# Altium footprint library ICs.PcbLib: 29 footprints (part 2 of 2)
Each footprint in its own frame and in the unit in brackets; x right, y up, seen from the top. Pads: shape width x height; smd on the part's side, far side on the other; paste and mask are expansions set on the pad; w line width, h text height; cw(c..) or ccw(c..) is an arc to the next point about the centre after c.
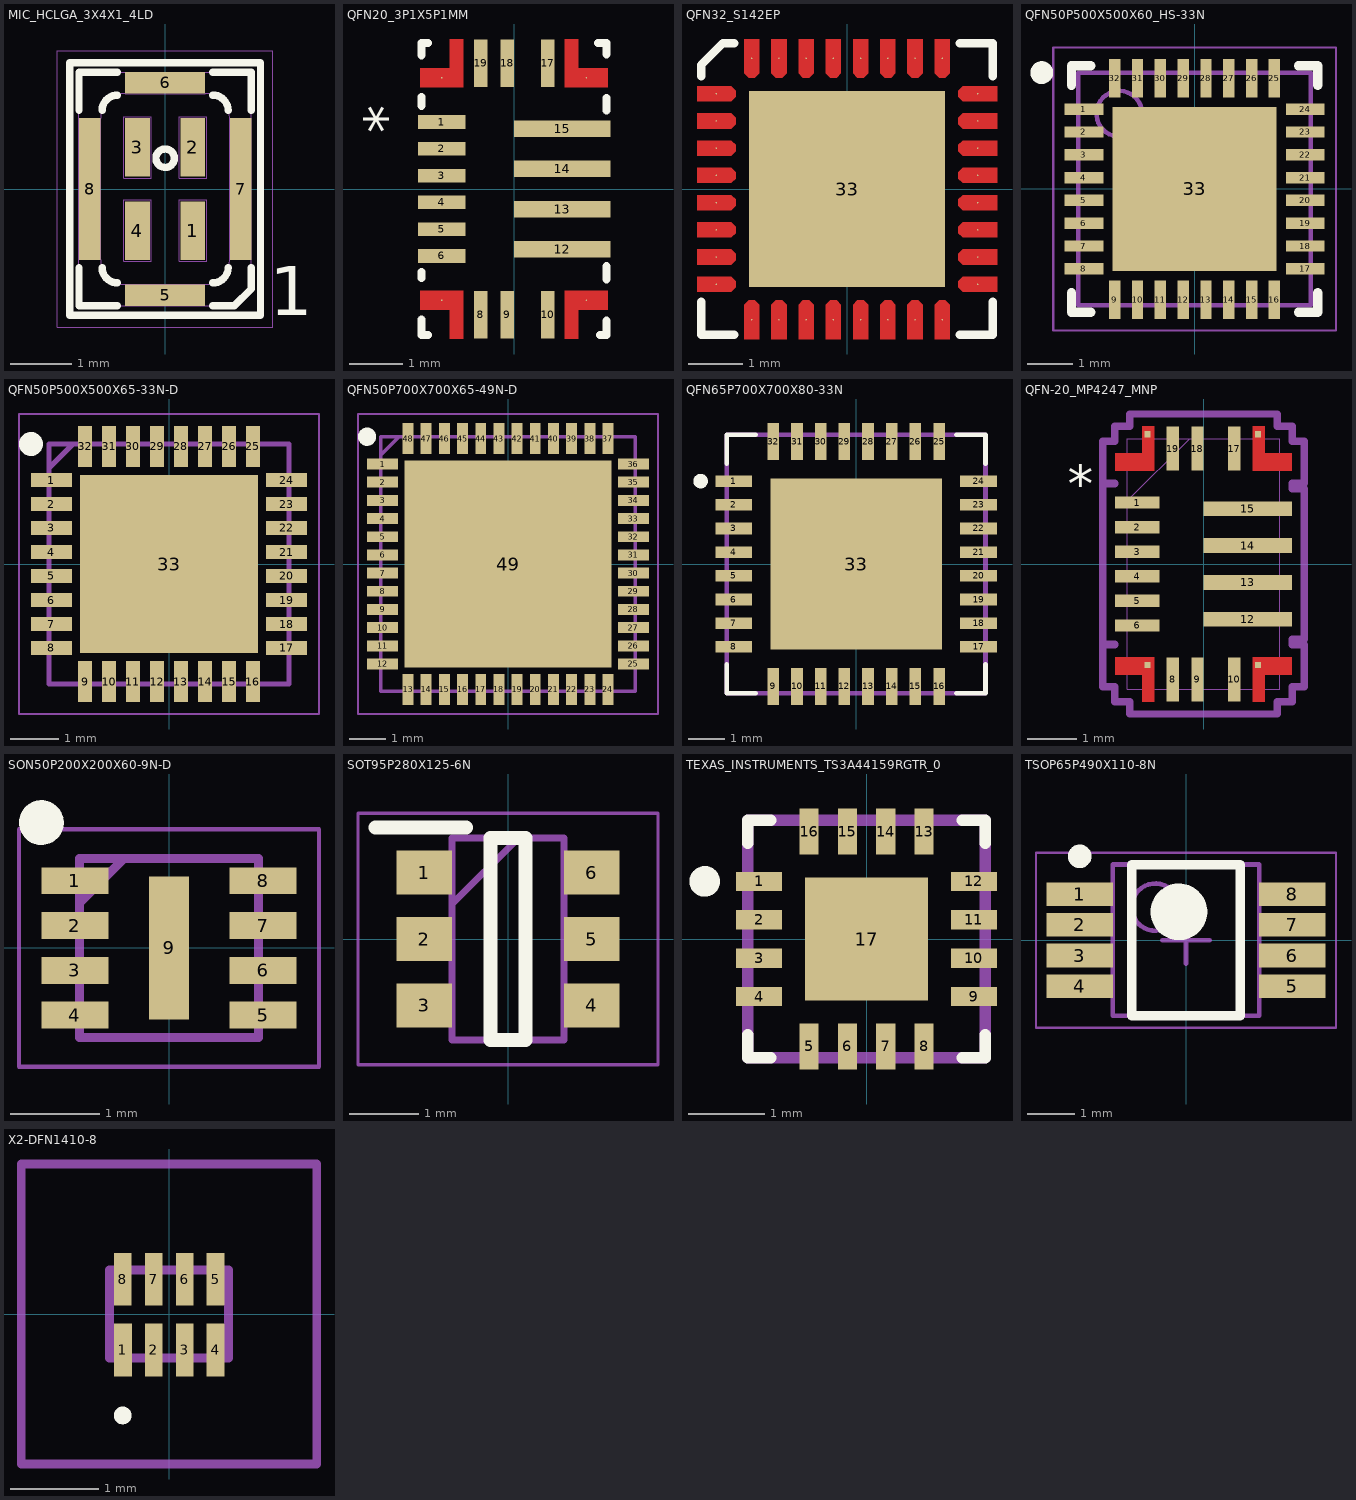
[diagram p1: the footprints below, top view; thin cyan lines are the x and y axes]

## MIC_HCLGA_3X4X1_4LD [mm]
pads (8):
  rect 0.4x0.95 smd paste+0 mask+0.05: 1(0.45,-0.675) 2(0.45,0.675) 3(-0.45,0.675) 4(-0.45,-0.675)
  rect 1.3x0.35 smd paste+0 mask+0.05: 5(0,-1.725) 6(0,1.725)
  rect 0.35x2.3 smd paste+0 mask+0.05: 7(1.225,0) 8(-1.225,0)
Top Overlay:
  circle w0.12: c0,0.5 r0.15
  lines w0.12: -1.4,-1.275 -1.4,-1.9 -0.775,-1.9 ; -1.4,1.275 -1.4,1.9 -0.775,1.9 ; -1.025,-1.275 ccw(c-0.775,-1.275) -0.775,-1.525 ; -1.025,1.275 cw(c-0.775,1.275) -0.775,1.525 ; 0.775,-1.9 1.125,-1.9 1.4,-1.625 1.4,-1.275 ; 0.775,-1.525 ccw(c0.775,-1.275) 1.025,-1.275 ; 0.775,1.525 cw(c0.775,1.275) 1.025,1.275 ; 0.775,1.9 1.4,1.9 1.4,1.275 ; -1.55,-2.05 1.55,-2.05 1.55,2.05 -1.55,2.05 -1.55,-2.05
  text "1" at 1.7,-2.05 h0.8
Mechanical 20:
  lines w0.01: -1.75,-2.25 1.75,-2.25 1.75,2.25 -1.75,2.25 -1.75,-2.25
Mechanical 27:
  circle w0.01: c0,0.5 r0.175
  lines w0.01: -1.55,-2.05 -1.55,2.05 1.55,2.05 1.55,-2.05 -1.55,-2.05 ; -1.4,-1.9 0.65,-1.9 0.875,-1.9 1.125,-1.9 1.4,-1.625 1.4,1.15 1.4,1.9 -1.4,1.9 -1.4,-1.875 -1.4,-1.9 ; -1.05,-1.15 ccw(c-0.65,-1.15) -0.65,-1.55 0.65,-1.55 ccw(c0.65,-1.15) 1.05,-1.15 1.05,1.15 ccw(c0.65,1.15) 0.65,1.55 -0.65,1.55 ccw(c-0.65,1.15) -1.05,1.15 -1.05,-1.15 ; -0.675,-1.175 -0.675,-0.175 -0.225,-0.175 -0.225,-1.175 -0.675,-1.175 ; -0.675,0.175 -0.225,0.175 -0.225,1.175 -0.675,1.175 -0.675,0.175 ; 0.225,-1.175 0.225,-0.175 0.675,-0.175 0.675,-1.175 0.225,-1.175 ; 0.225,0.175 0.225,1.175 0.675,1.175 0.675,0.175 0.225,0.175
  text "1" at 0.35,-0.925 h0.5
  text "3" at -0.675,0.325 h0.5
  text "4" at -0.675,-1.05 h0.5
  text "2" at 0.2,0.325 h0.5
3D body: height 1.03, standoff 1.02, extent -0.099,0.4 0.1,0.6
3D body: height 1.02, standoff 1.01, extent -0.248,0.251 0.25,0.75
3D body: height 1.01, standoff 1, extent -0.347,0.151 0.35,0.849
3D body: height 1, standoff 0, extent -1.45,-1.95 1.45,1.95

## QFN20_3P1X5P1MM [mil] "QFN20_3P1X5P1MM"
pads (20):
  rect 35x10 smd mask+2: 1(-53.29,49.21) 2(-53.29,29.53) 3(-53.29,9.84) 4(-53.29,-9.84) 5(-53.29,-29.53) 6(-53.29,-49.21)
  round 1 smd mask+2: 7(-53.29,-81.69) 11(53.01,-81.69) 16(53.01,81.69) 20(-53.29,81.69)
  rect 10x35 smd mask+2: 8(-24.75,-92.52) 9(-5.06,-92.52) 10(24.47,-92.52) 17(24.47,92.52) 18(-5.06,92.52) 19(-24.75,92.52)
  rect 71x12 smd mask+2: 12(35.29,-44.29) 13(35.29,-14.76) 14(35.29,14.76) 15(35.29,44.29)
Top Layer:
  region: -69.04,74.8 -69.04,88.58 -47.38,88.58 -47.38,110.23 -37.54,110.23 -37.54,74.8
  region: 37.26,110.23 37.26,74.8 68.76,74.8 68.76,88.58 47.1,88.58 47.1,110.23
  region: -37.54,-110.23 -37.54,-74.8 -69.04,-74.8 -69.04,-88.58 -47.38,-88.58 -47.38,-110.23
  region: 68.76,-74.8 68.76,-88.58 47.1,-88.58 47.1,-110.23 37.26,-110.23 37.26,-74.8
Top Overlay:
  lines w6: -68.16,-95.92 -68.16,-107.39 -63.42,-107.39 ; -68.16,-65.31 -68.16,-61.09 ; -68.16,61.17 -68.16,67.64 ; -68.16,98.24 -68.16,107.39 -63.29,107.39 ; 61.47,107.39 67.88,107.39 67.88,98.98 ; 63.08,-107.39 67.88,-107.39 67.88,-96.87 ; 67.88,-66.28 67.88,-56.71 ; 67.88,57.8 67.88,66.91
  text ".Designator" at -107,-172 h35
  text "*" at -80,41 h30
3D body "MP4247GQV.step": height 32.53, standoff -0.94, extent -59,-98.43 59.11,98.43

## QFN32_S142EP [mil] "QFN32_S142EP"
pads (33):
  round 1 smd: 1(-94.5,68.95) 2(-94.5,49.25) 3(-94.5,29.55) 4(-94.5,9.85) 5(-94.5,-9.85) 6(-94.5,-29.55) 7(-94.5,-49.25) 8(-94.5,-68.95) 9(-68.95,-94.5) 10(-49.25,-94.5) 11(-29.55,-94.5) 12(-9.85,-94.5) 13(9.85,-94.5) 14(29.55,-94.5) 15(49.25,-94.5) 16(68.95,-94.5) 17(94.5,-68.95) 18(94.5,-49.25) 19(94.5,-29.55) 20(94.5,-9.85) 21(94.5,9.85) 22(94.5,29.55) 23(94.5,49.25) 24(94.5,68.95) 25(68.95,94.5) 26(49.25,94.5) 27(29.55,94.5) 28(9.85,94.5) 29(-9.85,94.5) 30(-29.55,94.5) 31(-49.25,94.5) 32(-68.95,94.5)
  rect 142x142 smd: 33(0,0)
Top Layer:
  region: -108.5,63.45 -108.5,74.45 -86,74.45 -83.72,74.45 -80.5,71.23 -80.5,66.67 -83.72,63.45 -86,63.45
  region: -108.5,-74.45 -108.5,-63.45 -86,-63.45 -83.72,-63.45 -80.5,-66.67 -80.5,-71.23 -83.72,-74.45 -86,-74.45
  region: -108.5,-54.75 -108.5,-43.75 -86,-43.75 -83.72,-43.75 -80.5,-46.97 -80.5,-51.53 -83.72,-54.75 -86,-54.75
  region: -108.5,-35.05 -108.5,-24.05 -86,-24.05 -83.72,-24.05 -80.5,-27.27 -80.5,-31.83 -83.72,-35.05 -86,-35.05
  region: -108.5,-15.35 -108.5,-4.35 -86,-4.35 -83.72,-4.35 -80.5,-7.57 -80.5,-12.13 -83.72,-15.35 -86,-15.35
  region: -108.5,4.35 -108.5,15.35 -86,15.35 -83.72,15.35 -80.5,12.13 -80.5,7.57 -83.72,4.35 -86,4.35
  region: -108.5,24.05 -108.5,35.05 -86,35.05 -83.72,35.05 -80.5,31.83 -80.5,27.27 -83.72,24.05 -86,24.05
  region: -108.5,43.75 -108.5,54.75 -86,54.75 -83.72,54.75 -80.5,51.53 -80.5,46.97 -83.72,43.75 -86,43.75
  region: -74.45,108.5 -63.45,108.5 -63.45,86 -63.45,83.72 -66.67,80.5 -71.23,80.5 -74.45,83.72 -74.45,86
  region: -63.45,-108.5 -74.45,-108.5 -74.45,-86 -74.45,-83.72 -71.23,-80.5 -66.67,-80.5 -63.45,-83.72 -63.45,-86
  region: -54.75,108.5 -43.75,108.5 -43.75,86 -43.75,83.72 -46.97,80.5 -51.53,80.5 -54.75,83.72 -54.75,86
  region: -43.75,-108.5 -54.75,-108.5 -54.75,-86 -54.75,-83.72 -51.53,-80.5 -46.97,-80.5 -43.75,-83.72 -43.75,-86
  region: -35.05,108.5 -24.05,108.5 -24.05,86 -24.05,83.72 -27.27,80.5 -31.83,80.5 -35.05,83.72 -35.05,86
  region: -24.05,-108.5 -35.05,-108.5 -35.05,-86 -35.05,-83.72 -31.83,-80.5 -27.27,-80.5 -24.05,-83.72 -24.05,-86
  region: -15.35,108.5 -4.35,108.5 -4.35,86 -4.35,83.72 -7.57,80.5 -12.13,80.5 -15.35,83.72 -15.35,86
  region: -4.35,-108.5 -15.35,-108.5 -15.35,-86 -15.35,-83.72 -12.13,-80.5 -7.57,-80.5 -4.35,-83.72 -4.35,-86
  region: 4.35,108.5 15.35,108.5 15.35,86 15.35,83.72 12.13,80.5 7.57,80.5 4.35,83.72 4.35,86
  region: 15.35,-108.5 4.35,-108.5 4.35,-86 4.35,-83.72 7.57,-80.5 12.13,-80.5 15.35,-83.72 15.35,-86
  region: 24.05,108.5 35.05,108.5 35.05,86 35.05,83.72 31.83,80.5 27.27,80.5 24.05,83.72 24.05,86
  region: 35.05,-108.5 24.05,-108.5 24.05,-86 24.05,-83.72 27.27,-80.5 31.83,-80.5 35.05,-83.72 35.05,-86
  region: 43.75,108.5 54.75,108.5 54.75,86 54.75,83.72 51.53,80.5 46.97,80.5 43.75,83.72 43.75,86
  region: 54.75,-108.5 43.75,-108.5 43.75,-86 43.75,-83.72 46.97,-80.5 51.53,-80.5 54.75,-83.72 54.75,-86
  region: 63.45,108.5 74.45,108.5 74.45,86 74.45,83.72 71.23,80.5 66.67,80.5 63.45,83.72 63.45,86
  region: 74.45,-108.5 63.45,-108.5 63.45,-86 63.45,-83.72 66.67,-80.5 71.23,-80.5 74.45,-83.72 74.45,-86
  region: 108.5,74.45 108.5,63.45 86,63.45 83.72,63.45 80.5,66.67 80.5,71.23 83.72,74.45 86,74.45
  region: 108.5,-63.45 108.5,-74.45 86,-74.45 83.72,-74.45 80.5,-71.23 80.5,-66.67 83.72,-63.45 86,-63.45
  region: 108.5,-43.75 108.5,-54.75 86,-54.75 83.72,-54.75 80.5,-51.53 80.5,-46.97 83.72,-43.75 86,-43.75
  region: 108.5,-24.05 108.5,-35.05 86,-35.05 83.72,-35.05 80.5,-31.83 80.5,-27.27 83.72,-24.05 86,-24.05
  region: 108.5,-4.35 108.5,-15.35 86,-15.35 83.72,-15.35 80.5,-12.13 80.5,-7.57 83.72,-4.35 86,-4.35
  region: 108.5,15.35 108.5,4.35 86,4.35 83.72,4.35 80.5,7.57 80.5,12.13 83.72,15.35 86,15.35
  region: 108.5,35.05 108.5,24.05 86,24.05 83.72,24.05 80.5,27.27 80.5,31.83 83.72,35.05 86,35.05
  region: 108.5,54.75 108.5,43.75 86,43.75 83.72,43.75 80.5,46.97 80.5,51.53 83.72,54.75 86,54.75
Top Overlay:
  lines w6: -105.51,-81.46 -105.51,-105.51 -81.46,-105.51 ; -105.51,81.46 -105.51,89.76 -89.76,105.51 -81.46,105.51 ; 81.46,-105.51 105.51,-105.51 105.51,-81.46 ; 81.46,105.51 105.51,105.51 105.51,81.46
  text ".Designator" at -121,-160 h35
Top Paste:
  dashed: -60,-30 -60,-60 -30,-60 -30,-30
  dashed: -60,15 -60,-15 -30,-15 -30,15
  dashed: -15,15 -15,-15 15,-15 15,15
  dashed: -15,-30 -15,-60 15,-60 15,-30
  dashed: 30,-30 30,-60 60,-60 60,-30
  dashed: 30,15 30,-15 60,-15 60,15
  dashed: 30,60 30,30 60,30 60,60
  dashed: -15,60 -15,30 15,30 15,60
  dashed: -60,60 -60,30 -30,30 -30,60
3D body "QFN50P500X500X60_HS-33N.step": height 23.62, standoff 0, extent -102.36,-102.36 102.36,102.36

## QFN50P500X500X60_HS-33N [mm] "QFN, 32-Leads, Body 5.00x5.00mm, Pitch 0.50mm, Thermal Pad 3.60x3.60mm, IPC Medium Density"
height 0.6
pads (33):
  rect 0.85x0.25 smd mask+0.025: 1(-2.425,1.75) 2(-2.425,1.25) 3(-2.425,0.75) 4(-2.425,0.25) 5(-2.425,-0.25) 6(-2.425,-0.75) 7(-2.425,-1.25) 8(-2.425,-1.75) 17(2.425,-1.75) 18(2.425,-1.25) 19(2.425,-0.75) 20(2.425,-0.25) 21(2.425,0.25) 22(2.425,0.75) 23(2.425,1.25) 24(2.425,1.75)
  rect 0.25x0.85 smd mask+0.025: 9(-1.75,-2.425) 10(-1.25,-2.425) 11(-0.75,-2.425) 12(-0.25,-2.425) 13(0.25,-2.425) 14(0.75,-2.425) 15(1.25,-2.425) 16(1.75,-2.425) 25(1.75,2.425) 26(1.25,2.425) 27(0.75,2.425) 28(0.25,2.425) 29(-0.25,2.425) 30(-0.75,2.425) 31(-1.25,2.425) 32(-1.75,2.425)
  rect 3.6x3.6 smd mask+0.025: 33(0,0)
Top Overlay:
  circle w0.25: c-3.35,2.55 r0.125
  lines w0.2: -2.7,-2.275 -2.7,-2.7 -2.275,-2.7 ; -2.7,2.275 -2.7,2.7 -2.275,2.7 ; 2.275,-2.7 2.7,-2.7 2.7,-2.275 ; 2.275,2.7 2.7,2.7 2.7,2.275
Top Courtyard:
  lines w0.05: -3.1,-3.1 -3.1,3.1 3.1,3.1 3.1,-3.1 -3.1,-3.1
  lines w0.1: -0.5,0 0.5,0 ; 0,-0.5 0,0.5
Top Assembly:
  circle w0.1: c-1.65,1.65 r0.5
  lines w0.1: -2.55,-2.55 -2.55,2.55 2.55,2.55 2.55,-2.55 -2.55,-2.55
3D body "QFN50P500X500X60_HS-33N.step": height 0.6, standoff 0, extent -2.6,-2.6 2.6,2.6

## QFN50P500X500X65-33N-D [mm]
pads (33):
  rect 0.85x0.3 smd: 1(-2.45,1.75) 2(-2.45,1.25) 3(-2.45,0.75) 4(-2.45,0.25) 5(-2.45,-0.25) 6(-2.45,-0.75) 7(-2.45,-1.25) 8(-2.45,-1.75) 17(2.45,-1.75) 18(2.45,-1.25) 19(2.45,-0.75) 20(2.45,-0.25) 21(2.45,0.25) 22(2.45,0.75) 23(2.45,1.25) 24(2.45,1.75)
  rect 0.3x0.85 smd: 9(-1.75,-2.45) 10(-1.25,-2.45) 11(-0.75,-2.45) 12(-0.25,-2.45) 13(0.25,-2.45) 14(0.75,-2.45) 15(1.25,-2.45) 16(1.75,-2.45) 25(1.75,2.45) 26(1.25,2.45) 27(0.75,2.45) 28(0.25,2.45) 29(-0.25,2.45) 30(-0.75,2.45) 31(-1.25,2.45) 32(-1.75,2.45)
  rect 3.7x3.7 smd: 33(0,0)
Top Overlay:
  circle w0.25: c-2.875,2.5 r0.125
Mechanical 15:
  lines w0.1: -2.5,2 -2,2.5 ; -2.5,-2.5 2.5,-2.5 2.5,2.5 -2.5,2.5 -2.5,-2.5
Mechanical 20:
  lines w0.05: -3.125,-3.125 3.125,-3.125 3.125,3.125 -3.125,3.125 -3.125,-3.125
3D body "MWPR1516CFM.stp": height 0.65, standoff 0, extent -2.55,-2.55 2.55,2.55

## QFN50P700X700X65-49N-D [mm]
pads (49):
  rect 0.85x0.3 smd mask+0: 1(-3.45,2.75) 2(-3.45,2.25) 3(-3.45,1.75) 4(-3.45,1.25) 5(-3.45,0.75) 6(-3.45,0.25) 7(-3.45,-0.25) 8(-3.45,-0.75) 9(-3.45,-1.25) 10(-3.45,-1.75) 11(-3.45,-2.25) 12(-3.45,-2.75) 25(3.45,-2.75) 26(3.45,-2.25) 27(3.45,-1.75) 28(3.45,-1.25) 29(3.45,-0.75) 30(3.45,-0.25) 31(3.45,0.25) 32(3.45,0.75) 33(3.45,1.25) 34(3.45,1.75) 35(3.45,2.25) 36(3.45,2.75)
  rect 0.3x0.85 smd mask+0: 13(-2.75,-3.45) 14(-2.25,-3.45) 15(-1.75,-3.45) 16(-1.25,-3.45) 17(-0.75,-3.45) 18(-0.25,-3.45) 19(0.25,-3.45) 20(0.75,-3.45) 21(1.25,-3.45) 22(1.75,-3.45) 23(2.25,-3.45) 24(2.75,-3.45) 37(2.75,3.45) 38(2.25,3.45) 39(1.75,3.45) 40(1.25,3.45) 41(0.75,3.45) 42(0.25,3.45) 43(-0.25,3.45) 44(-0.75,3.45) 45(-1.25,3.45) 46(-1.75,3.45) 47(-2.25,3.45) 48(-2.75,3.45)
  rect 5.7x5.7 smd mask+0: 49(0,0)
Top Overlay:
  circle w0.25: c-3.875,3.5 r0.125
Mechanical 13:
  lines w0.1: -3.5,3 -3,3.5 ; -3.5,-3.5 3.5,-3.5 3.5,3.5 -3.5,3.5 -3.5,-3.5
Mechanical 15:
  lines w0.05: -4.125,-4.125 4.125,-4.125 4.125,4.125 -4.125,4.125 -4.125,-4.125
3D body "STM32G0B1CEU6.stp": height 0.61, standoff 0, extent -3.556,-3.556 3.556,3.556

## QFN65P700X700X80-33N [mm]
pads (33):
  rect 1.01x0.32 smd: 1(-3.36,2.275) 2(-3.36,1.625) 3(-3.36,0.975) 4(-3.36,0.325) 5(-3.36,-0.325) 6(-3.36,-0.975) 7(-3.36,-1.625) 8(-3.36,-2.275) 17(3.36,-2.275) 18(3.36,-1.625) 19(3.36,-0.975) 20(3.36,-0.325) 21(3.36,0.325) 22(3.36,0.975) 23(3.36,1.625) 24(3.36,2.275)
  rect 0.32x1.01 smd: 9(-2.275,-3.36) 10(-1.625,-3.36) 11(-0.975,-3.36) 12(-0.325,-3.36) 13(0.325,-3.36) 14(0.975,-3.36) 15(1.625,-3.36) 16(2.275,-3.36) 25(2.275,3.36) 26(1.625,3.36) 27(0.975,3.36) 28(0.325,3.36) 29(-0.325,3.36) 30(-0.975,3.36) 31(-1.625,3.36) 32(-2.275,3.36)
  rect 4.7x4.7 smd paste+0: 33(0,0)
Top Overlay:
  circle w0.2: c-4.27,2.275 r0.1
  lines w0.127: -3.55,-2.755 -3.55,-3.55 -2.755,-3.55 ; -3.55,2.755 -3.55,3.55 -2.755,3.55 ; 2.755,-3.55 3.55,-3.55 3.55,-2.755 ; 2.755,3.55 3.55,3.55 3.55,2.755
Top Paste:
  region: -1.915,0.435 -1.915,1.915 -0.435,1.915 -0.435,0.435
  region: 0.435,0.435 0.435,1.915 1.915,1.915 1.915,0.435
  region: -1.915,-1.915 -1.915,-0.435 -0.435,-0.435 -0.435,-1.915
  region: 0.435,-1.915 0.435,-0.435 1.915,-0.435 1.915,-1.915
Mechanical 3:
  lines w0.127: -3.55,-3.55 3.55,-3.55 3.55,3.55 -3.55,3.55 -3.55,-3.55
3D body "21-0144_T32772_MXM.step": height 0.81, standoff 0, extent -3.556,-3.556 3.556,3.556

## QFN-20_MP4247_MNP [mm]
pads (20):
  rect 0.9x0.25 smd paste+0 mask+0.051: 1(-1.35,1.25) 2(-1.35,0.75) 3(-1.35,0.25) 4(-1.35,-0.25) 5(-1.35,-0.75) 6(-1.35,-1.25)
  rect 0.127x0.127 smd paste-0.064 mask-0.064: 7(-1.143,-2.057) 11(1.108,-2.057) 16(1.108,2.643) 20(-1.143,2.643)
  rect 0.25x0.9 smd paste+0 mask+0.051: 8(-0.625,-2.35) 9(-0.125,-2.35) 10(0.625,-2.35) 17(0.625,2.35) 18(-0.125,2.35) 19(-0.625,2.35)
  rect 1.8x0.3 smd paste+0 mask+0.051: 12(0.9,-1.125) 13(0.9,-0.375) 14(0.9,0.375) 15(0.9,1.125)
Top Layer:
  region: 1,2.8 1.25,2.8 1.25,2.25 1.8,2.25 1.8,1.9 1,1.9
  region: -1,2.8 -1.25,2.8 -1.25,2.25 -1.8,2.25 -1.8,1.9 -1,1.9
  region: -1,-2.8 -1.25,-2.8 -1.25,-2.25 -1.8,-2.25 -1.8,-1.9 -1,-1.9
  region: 1,-2.8 1.25,-2.8 1.25,-2.25 1.8,-2.25 1.8,-1.9 1,-1.9
Top Overlay:
  text "*" at -2.769,1.245 h0.76
Top Paste:
  region: 1,-2.8 1.25,-2.8 1.25,-2.25 1.8,-2.25 1.8,-1.9 1,-1.9
  region: -1,-2.8 -1.25,-2.8 -1.25,-2.25 -1.8,-2.25 -1.8,-1.9 -1,-1.9
  region: 1,2.8 1.25,2.8 1.25,2.25 1.8,2.25 1.8,1.9 1,1.9
  region: -1,2.8 -1.25,2.8 -1.25,2.25 -1.8,2.25 -1.8,1.9 -1,1.9
Top Solder:
  region: 1,-2.8 1.25,-2.8 1.25,-2.25 1.8,-2.25 1.8,-1.9 1,-1.9
  region: -1,-2.8 -1.25,-2.8 -1.25,-2.25 -1.8,-2.25 -1.8,-1.9 -1,-1.9
  region: 1,2.8 1.25,2.8 1.25,2.25 1.8,2.25 1.8,1.9 1,1.9
  region: -1,2.8 -1.25,2.8 -1.25,2.25 -1.8,2.25 -1.8,1.9 -1,1.9
Mechanical 13:
  lines w0.025: -1.549,1.283 -0.279,2.553 ; -1.549,-2.553 1.549,-2.553 1.549,2.553 -1.549,2.553 -1.549,-2.553
  text "*" at -0.583,0.615 h1.27
Mechanical 15:
  lines w0.152: -2.054,-2.504 -1.803,-2.504 -1.803,-2.807 -1.504,-2.807 -1.504,-3.054 1.504,-3.054 1.504,-2.807 1.803,-2.807 1.803,-2.504 2.054,-2.504 2.054,-1.646 1.803,-1.646 1.803,-1.529 2.054,-1.529 2.054,1.529 1.803,1.529 1.803,1.646 2.054,1.646 2.054,2.504 1.803,2.504 1.803,2.807 1.504,2.807 1.504,3.054 -1.504,3.054 -1.504,2.807 -1.803,2.807 -1.803,2.504 -2.054,2.504 -2.054,1.646 -1.803,1.646 -1.803,1.629 -2.054,1.629 -2.054,-1.629 -1.803,-1.629 -1.803,-1.646 -2.054,-1.646 -2.054,-2.504
3D body "MP4247GQV.step": height 0.83, standoff -0.02, extent -1.501,-2.502 1.499,2.498

## SON50P200X200X60-9N-D [mm]
pads (9):
  rect 0.75x0.3 smd mask+0.025: 1(-1.05,0.75) 2(-1.05,0.25) 3(-1.05,-0.25) 4(-1.05,-0.75) 5(1.05,-0.75) 6(1.05,-0.25) 7(1.05,0.25) 8(1.05,0.75)
  rect 0.45x1.6 smd mask+0.025: 9(0,0)
Top Overlay:
  circle w0.25: c-1.425,1.4 r0.125
Mechanical 13:
  lines w0.1: -1,0.5 -0.5,1 ; -1,-1 -1,1 1,1 1,-1 -1,-1
Mechanical 15:
  lines w0.05: -1.675,-1.325 -1.675,1.325 1.675,1.325 1.675,-1.325 -1.675,-1.325
3D body "TSV772IQ2T.stp": height 0.6, standoff 0, extent -1.05,-1 1.05,1

## SOT95P280X125-6N [mm]
pads (6):
  rect 0.8x0.63 smd: 1(-1.2,0.95) 2(-1.2,0) 3(-1.2,-0.95) 4(1.2,-0.95) 5(1.2,0) 6(1.2,0.95)
Top Overlay:
  lines w0.2: -1.9,1.6 -0.6,1.6 ; -0.25,-1.45 -0.25,1.45 0.25,1.45 0.25,-1.45 -0.25,-1.45
Mechanical 13:
  lines w0.1: -0.8,0.5 0.15,1.45 ; -0.8,-1.45 -0.8,1.45 0.8,1.45 0.8,-1.45 -0.8,-1.45
Mechanical 15:
  lines w0.05: -2.15,-1.8 -2.15,1.8 2.15,1.8 2.15,-1.8 -2.15,-1.8
3D body "AOZ1280CI.stp": height 1.25, standoff 0, extent -1.4,-1.45 1.4,1.45

## TEXAS_INSTRUMENTS_TS3A44159RGTR_0 [mm]
pads (17):
  rect 0.6x0.25 smd mask+0.051: 1(-1.4,0.75) 2(-1.4,0.25) 3(-1.4,-0.25) 4(-1.4,-0.75) 9(1.4,-0.75) 10(1.4,-0.25) 11(1.4,0.25) 12(1.4,0.75)
  rect 0.25x0.6 smd mask+0.051: 5(-0.75,-1.4) 6(-0.25,-1.4) 7(0.25,-1.4) 8(0.75,-1.4) 13(0.75,1.4) 14(0.25,1.4) 15(-0.25,1.4) 16(-0.75,1.4)
  rect 1.6x1.6 smd mask+0.051: 17(0,0)
Top Overlay:
  circle w0.2: c-2.111,0.751 r0.1
  lines w0.15: -1.55,-1.25 -1.55,-1.55 -1.25,-1.55 ; -1.55,1.25 -1.55,1.55 -1.25,1.55 ; 1.25,-1.55 1.55,-1.55 1.55,-1.25 ; 1.25,1.55 1.55,1.55 1.55,1.25
Mechanical 3:
  lines w0.15: -1.55,-1.55 -1.55,1.55 1.55,1.55 1.55,-1.55 -1.55,-1.55
3D body "TS3A44159RGTR.stp": height 1, standoff 0, extent -1.5,-1.5 1.5,1.5

## TSOP65P490X110-8N [mm] "TSOP, 8-Leads, Body 3.00x2.95mm, Pitch 0.65mm, IPC Medium Density"
height 1.1
pads (8):
  rect 1.4x0.5 smd mask+0.025: 1(-2.25,0.975) 2(-2.25,0.325) 3(-2.25,-0.325) 4(-2.25,-0.975) 5(2.25,-0.975) 6(2.25,-0.325) 7(2.25,0.325) 8(2.25,0.975)
Top Overlay:
  circle w0.25: c-2.25,1.775 r0.125
  circle w0.6: c-0.15,0.6 r0.3
  lines w0.2: -1.15,-1.6 -1.15,1.6 1.15,1.6 1.15,-1.6 -1.15,-1.6
Top Courtyard:
  lines w0.05: -3.175,-1.85 -3.175,1.85 3.175,1.85 3.175,-1.85 -3.175,-1.85
  lines w0.1: -0.5,0 0.5,0 ; 0,-0.5 0,0.5
Top Assembly:
  circle w0.1: c-0.65,0.7 r0.5
  lines w0.1: -1.55,-1.6 -1.55,1.6 1.55,1.6 1.55,-1.6 -1.55,-1.6
3D body "TSOP65P490X110-8N.step": height 1.1, standoff 0, extent -2.45,-1.6 2.45,1.6

## X2-DFN1410-8 [mm]
pads (8):
  rect 0.2x0.6 smd mask+0.025: 1(-0.522,-0.406) 2(-0.172,-0.406) 3(0.178,-0.406) 4(0.528,-0.406) 5(0.528,0.394) 6(0.178,0.394) 7(-0.172,0.394) 8(-0.522,0.394)
Top Overlay:
  lines w0.1: -0.525,-1.2 cw(c-0.525,-1.15) -0.525,-1.1 cw(c-0.525,-1.15) -0.525,-1.2
Mechanical 13:
  lines w0.1: -0.675,-0.5 0.675,-0.5 0.675,0.5 -0.675,0.5 -0.675,-0.5
Mechanical 15:
  lines w0.1: -1.675,-1.7 1.675,-1.7 1.675,1.7 -1.675,1.7 -1.675,-1.7
3D body "74LVC2T45HK3-7.stp": height 0.45, standoff 0, extent -0.675,-0.5 0.675,0.5